# Altium footprint library CMR_Miscellaneous_Devices.PcbLib: 103 footprints (part 1 of 7)
Each footprint in its own frame and in the unit in brackets; x right, y up, seen from the top. Pads: shape width x height; smd on the part's side, far side on the other; paste and mask are expansions set on the pad; w line width, h text height; cw(c..) or ccw(c..) is an arc to the next point about the centre after c.
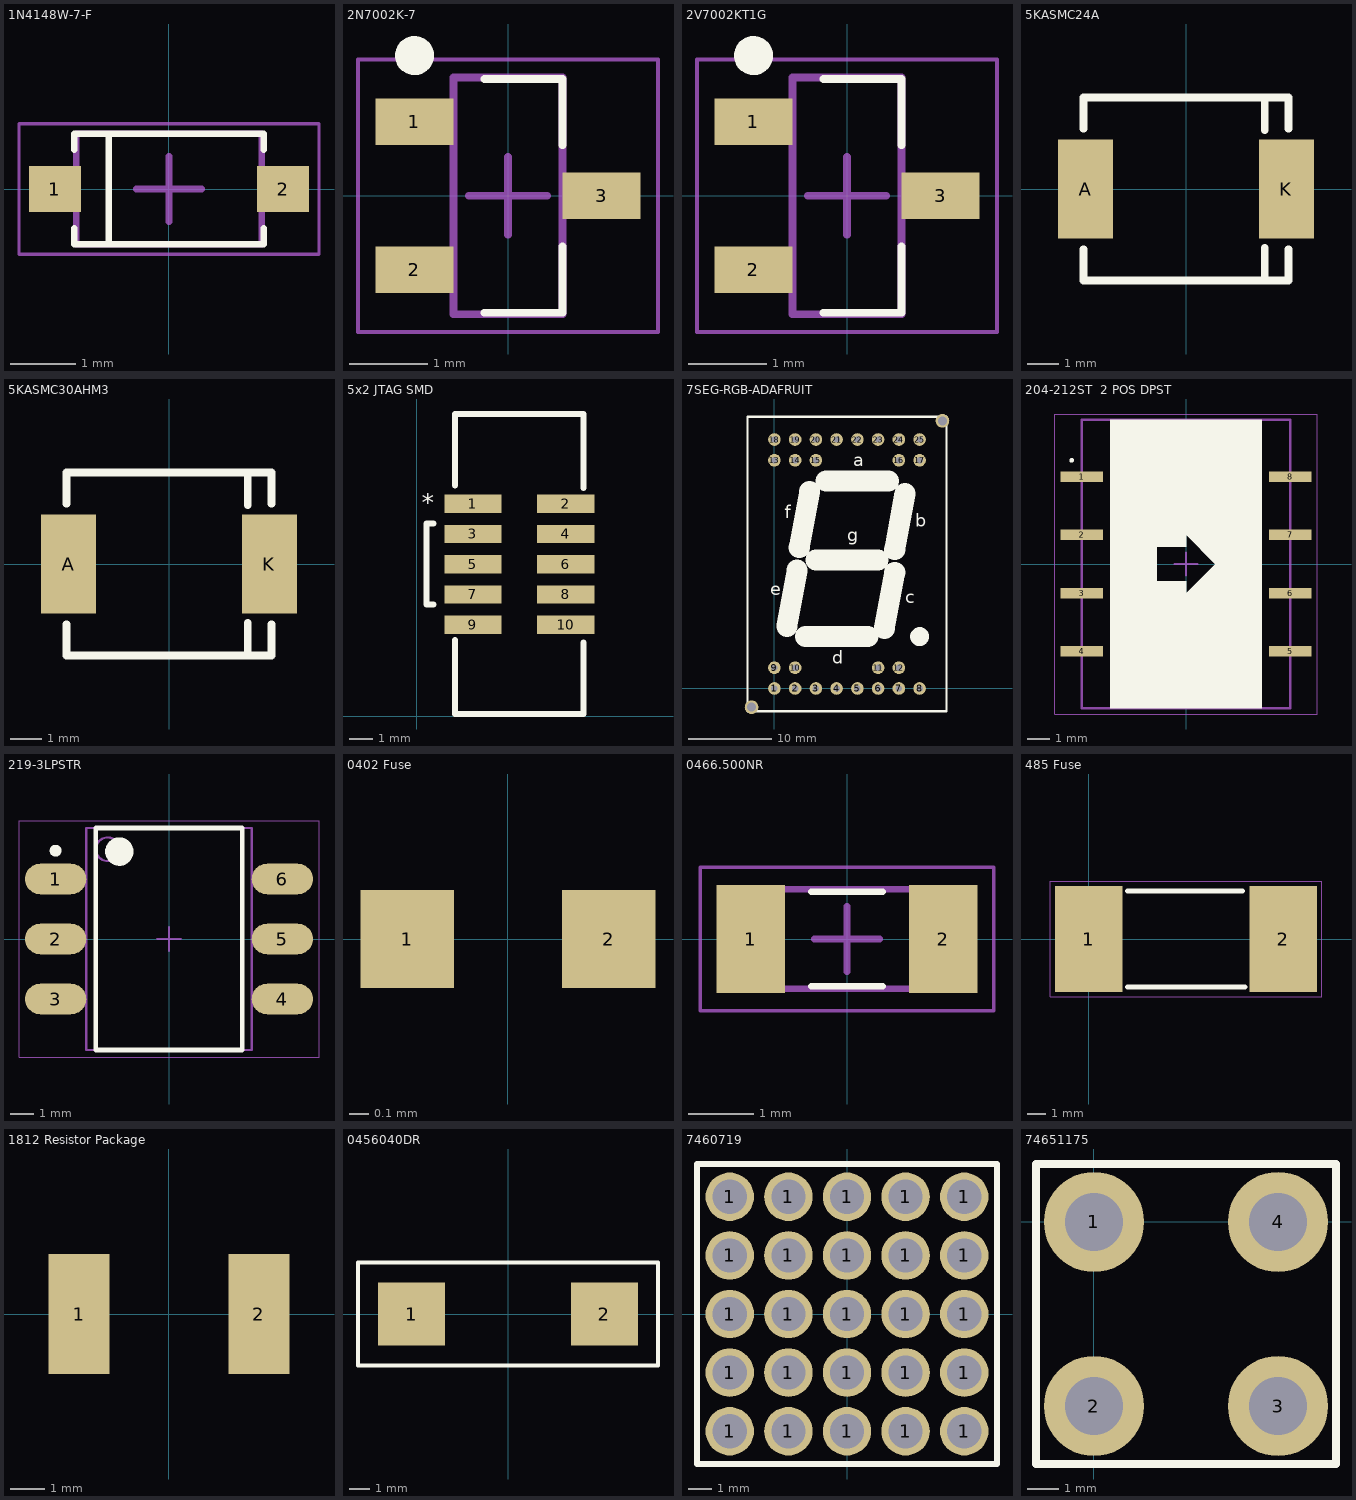
[diagram p0: the footprints below, top view; thin cyan lines are the x and y axes]

## 1N4148W-7-F [mm]
height 1.35
pads (2):
  rect 0.8x0.7 smd: 1(-1.75,0) 2(1.75,0)
Top Overlay:
  lines w0.1: -1.45,-0.6 -1.45,-0.85 1.45,-0.85 1.45,-0.6 ; -1.45,0.6 -1.45,0.85 1.45,0.85 1.45,0.6 ; -0.925,-0.825 -0.925,0.85
Mechanical 13:
  lines w0.1: -1.425,-0.85 -1.425,0.85 1.425,0.85 1.425,-0.85 -1.425,-0.85
Mechanical 15:
  lines w0.05: -2.3,-1 -2.3,1 2.3,1 2.3,-1 -2.3,-1
  lines w0.1: -0.5,0 0.5,0 ; 0,-0.5 0,0.5
3D body "1N4148W-7-F.step": height 1.35, standoff 0, extent -1.85,-0.85 1.85,0.85

## 2N7002K-7 [mm] "MOSFET N-CH 60V 0.38A SOT23-3"
height 1.11
pads (3):
  rect 1x0.6 smd: 1(-1.2,0.95) 2(-1.2,-0.95) 3(1.2,0)
Top Overlay:
  circle w0.25: c-1.2,1.8 r0.125
  lines w0.1: -0.3,-1.5 0.7,-1.5 0.7,-0.65 ; -0.3,1.5 0.7,1.5 0.7,0.65
Mechanical 13:
  lines w0.1: -0.7,-1.52 0.7,-1.52 0.7,1.52 -0.7,1.52 -0.7,-1.52
Mechanical 15:
  lines w0.05: -1.925,-1.75 1.925,-1.75 1.925,1.75 -1.925,1.75 -1.925,-1.75
  lines w0.1: -0.5,0 0.5,0 ; 0,-0.5 0,0.5
3D body "SOT23127P600-8N.step": height 1.11, standoff 0, extent -1.32,-1.52 1.32,1.52

## 2V7002KT1G [mm]
height 1.11
pads (3):
  rect 1x0.6 smd: 1(-1.2,0.95) 2(-1.2,-0.95) 3(1.2,0)
Top Overlay:
  circle w0.25: c-1.2,1.8 r0.125
  lines w0.1: -0.3,-1.5 0.7,-1.5 0.7,-0.65 ; -0.3,1.5 0.7,1.5 0.7,0.65
Mechanical 13:
  lines w0.1: -0.7,-1.52 0.7,-1.52 0.7,1.52 -0.7,1.52 -0.7,-1.52
Mechanical 15:
  lines w0.05: -1.925,-1.75 1.925,-1.75 1.925,1.75 -1.925,1.75 -1.925,-1.75
  lines w0.1: -0.5,0 0.5,0 ; 0,-0.5 0,0.5
3D body "SOT23127P600-8N.step": height 1.11, standoff 0, extent -1.32,-1.52 1.32,1.52

## 5KASMC24A [mil]
pads (2):
  rect 70x126 smd: A(-127.5,0) K(127.5,0)
Top Overlay:
  lines w10: -130,-76.5 -130,-116.14 130,-116.14 130,-76.49 ; -130,76.5 -130,116.14 130,116.14 130,76.49 ; 100,-116.14 100,-75 ; 100,75 100,116.14
3D body "DO-214AB SMC.STEP": height 91.47, standoff 0.82, extent -156.5,-116.15 156.5,116.13

## 5KASMC30AHM3 [mil]
pads (2):
  rect 70x126 smd: A(-127.5,0) K(127.5,0)
Top Overlay:
  lines w10: -130,-76.5 -130,-116.14 130,-116.14 130,-76.49 ; -130,76.5 -130,116.14 130,116.14 130,76.49 ; 100,-116.14 100,-75 ; 100,75 100,116.14
3D body "DO-214AB SMC.STEP": height 91.47, standoff 0.82, extent -156.5,-116.15 156.5,116.13

## 5x2 JTAG SMD [mm]
pads (10):
  rect 2.4x0.76 smd: 1(2.35,8.93) 2(6.25,8.93) 3(2.35,7.66) 4(6.25,7.66) 5(2.35,6.39) 6(6.25,6.39) 7(2.35,5.12) 8(6.25,5.12) 9(2.35,3.85) 10(6.25,3.85)
Top Overlay:
  lines w0.254: 0.7,4.7 0.4,4.7 0.4,8.1 0.7,8.1 ; 1.6,3.2 1.6,0.1 7,0.1 7,3.1 ; 1.6,9.7 1.6,12.7 7,12.7 7,9.6
  text "*" at 0.2,8.6 h0.76
3D body "3220-10-0300.STEP": height 5.6, standoff 0, extent 1.55,0.075 7.05,12.725

## 7SEG-RGB-ADAFRUIT [mil]
pads (27):
  round 60 hole 30: 1(0,0) 2(98.42,0) 3(196.85,0) 4(295.27,0) 5(393.7,0) 6(492.13,0) 7(590.55,0) 8(688.98,0) 9(0,98.42) 10(98.42,98.42) 11(492.13,98.42) 12(590.55,98.42) 13(0,1082.68) 14(98.42,1082.68) 15(196.85,1082.68) 16(590.55,1082.68) 17(688.98,1082.68) 18(0,1181.1) 19(98.42,1181.1) 20(196.85,1181.1) 21(295.27,1181.1) 22(393.7,1181.1) 23(492.13,1181.1) 24(590.55,1181.1) 25(688.98,1181.1)
  round 65 hole 43.31 unplated: ""(-108.27,-88.58) ""(797.24,1269.68)
Top Overlay:
  lines w10: -127.95,-108.27 -127.95,1289.37 816.93,1289.37 816.93,-108.27 -127.95,-108.27
  lines w50: 708.25,241.79 cw(c688.98,246.06) 708.66,244.62
  lines w100: 59.05,295.28 108.27,561.02 ; 118.11,669.29 167.32,935.04 ; 147.64,246.06 442.91,246.06 ; 196.85,610.24 492.13,610.24 ; 246.06,984.25 541.34,984.25 ; 521.65,285.43 570.87,551.18 ; 570.87,659.45 620.08,925.2
  text "a" at 374.02,1053.15 h60
  text "b" at 669.29,767.72 h60
  text "c" at 620.08,403.54 h60
  text "d" at 275.59,118.11 h60
  text "e" at -19.68,442.91 h60
  text "f" at 49.21,807.09 h60
  text "g" at 344.49,698.82 h60
3D body "RGB-7SEG.STEP": height 342.52, standoff -39.37, extent -126.88,-108.64 818,1289

## 204-212ST  2 POS DPST [mm] "Dip Switch DPST 2 Position Surface Mount Slide (Standard) Actuator 50mA 24VDC"
height 7.6
pads (8):
  rect 1.85x0.45 smd: 1(-4.55,3.81) 2(-4.55,1.27) 3(-4.55,-1.27) 4(-4.55,-3.81) 5(4.55,-3.81) 6(4.55,-1.27) 7(4.55,1.27) 8(4.55,3.81)
Top Overlay:
  circle w0.1: c-4.987,4.523 r0.05
  region: -3.302,0 -1.27,0 -1.27,-0.762 0,-0.762 0,-1.27 1.27,0 3.302,0 3.302,-6.295 -3.302,-6.295
  region: -3.302,0 -1.27,0 -1.27,0.762 0,0.762 0,1.27 1.27,0 3.302,0 3.302,6.295 -3.302,6.295
Mechanical 13:
  lines w0.1: -4.55,-6.295 -4.55,6.295 4.55,6.295 4.55,-6.295 -4.55,-6.295
Mechanical 15:
  lines w0.05: -5.725,-6.545 -5.725,6.545 5.725,6.545 5.725,-6.545 -5.725,-6.545
  lines w0.1: -0.5,0 0.5,0 ; 0,-0.5 0,0.5
3D body: height 7.6, standoff 1.27, extent -4.55,-6.295 4.55,6.295
3D body: height 7.6, standoff 0, extent -5.015,-6.295 5.015,6.295

## 219-3LPSTR [mm] "SWITCH SLIDE DIP SPST 100MA 20V"
height 3.65
pads (6):
  oval 2.6x1.3 smd: 1(-4.8,2.54) 2(-4.8,0) 3(-4.8,-2.54) 4(4.8,-2.54) 5(4.8,0) 6(4.8,2.54)
Top Overlay:
  circle w0.6: c-2.1,3.7 r0.3
  circle w0.25: c-4.8,3.74 r0.125
  lines w0.2: -3.1,-4.7 3.1,-4.7 3.1,4.7 -3.1,4.7 -3.1,-4.7
Mechanical 13:
  circle w0.1: c-2.6,3.8 r0.5
  lines w0.1: -3.5,-4.7 3.5,-4.7 3.5,4.7 -3.5,4.7 -3.5,-4.7
Mechanical 15:
  lines w0.05: -6.35,-5 6.35,-5 6.35,5 -6.35,5 -6.35,-5
  lines w0.1: -0.5,0 0.5,0 ; 0,-0.5 0,0.5
3D body "219-3poles.stp": height 4.28, standoff -0.02, extent -4.955,-4.4 4.955,4.69

## 0402 Fuse [mm]
pads (2):
  rect 0.475x0.5 smd: 1(-0.512,0) 2(0.513,0)
3D body: height 0.25, standoff 0, extent -0.512,-0.25 0.513,0.25

## 0466.500NR [mm] ", 2-Leads, Body 3.18x1.52mm, IPC Medium Density"
height 0.58
pads (2):
  rect 1.05x1.65 smd: 1(-1.475,0) 2(1.475,0)
Top Overlay:
  lines w0.1: -0.55,-0.725 0.55,-0.725 ; -0.55,0.725 0.55,0.725
Mechanical 13:
  lines w0.1: -1.59,-0.76 -1.59,0.76 1.59,0.76 1.59,-0.76 -1.59,-0.76
Mechanical 15:
  lines w0.05: -2.25,-1.1 -2.25,1.1 2.25,1.1 2.25,-1.1 -2.25,-1.1
  lines w0.1: -0.5,0 0.5,0 ; 0,-0.5 0,0.5
3D body: height 0.58, standoff 0, extent -1.59,-0.76 1.59,0.76

## 485 Fuse [mil] "485 Series Fast-Blow Fuse"
pads (2):
  rect 140x220 smd: 1(0,0) 2(404,0)
Top Overlay:
  lines w10: 80,-100 325,-100 ; 80,100 320,100
Mechanical 15:
  lines w1.97: -80.71,-120.08 484.25,-120.08 484.25,120.08 -80.71,120.08 -80.71,-120.08
3D body: height 177, standoff 0, extent -2,-89 108,88
3D body: height 177, standoff 0, extent 296,-89 406,88
3D body: height 157, standoff 10, extent 108,-85 296,79

## 1812 Resistor Package [mm]
pads (2):
  rect 1.78x3.5 smd: 1(-2.615,0) 2(2.615,0)
3D body: height 10.15, standoff -4.59, extent -3.357,1.741 -3.357,1.741
3D body: height 0.75, standoff 0, extent -2.857,-1.6 2.658,1.6

## 0456040DR [mm]
pads (2):
  rect 3.25x3.05 smd: 1(-4.675,0) 2(4.675,0)
Top Overlay:
  lines w0.2: -7.275,-2.5 -7.275,0 -7.275,2.5 7.275,2.5 7.275,-2.5 -7.275,-2.5
3D body: height 3.05, standoff 0, extent -7.366,-2.54 7.366,2.54

## 7460719 [mm] "M8, thread 13mm"
height 24
pads (25):
  round 2.1 hole 1.475: 1(-5.08,-5.08) 1(-5.08,-2.54) 1(-5.08,0) 1(-5.08,2.54) 1(-5.08,5.08) 1(-2.54,-5.08) 1(-2.54,-2.54) 1(-2.54,0) 1(-2.54,2.54) 1(-2.54,5.08) 1(0,-5.08) 1(0,-2.54) 1(0,0) 1(0,2.54) 1(0,5.08) 1(2.54,-5.08) 1(2.54,-2.54) 1(2.54,0) 1(2.54,2.54) 1(2.54,5.08) 1(5.08,-5.08) 1(5.08,-2.54) 1(5.08,0) 1(5.08,2.54) 1(5.08,5.08)
Top Overlay:
  lines w0.254: -6.5,-6.5 -6.5,6.5 6.5,6.5 6.5,-6.5 -6.5,-6.5
3D body "7460719.stp": height 20.6, standoff -3.4, extent -6.5,-6.5 6.5,6.5

## 74651175 [mm]
pads (4):
  round 3.2 hole 1.85: 1(0,0) 2(0,-5.87) 3(5.87,-5.87) 4(5.87,0)
Top Overlay:
  lines w0.254: -1.85,-7.72 -1.85,1.85 7.72,1.85 7.72,-7.72 -1.85,-7.72
3D body: height 3, standoff 0, extent -1.905,-7.747 7.747,1.905
3D body: height 7, standoff 0, extent 0.421,-5.418 5.421,-0.424